# Altium schematic symbol library jlcpcb_2025_04_resistors_extended_1210.schlib: 2670 symbols (part 10 of 14) (continued)
## FRL1210JR390TS
designator R?  Resistance: 390mΩ  (hidden comment: *)
Resistor, 390mΩ, ±5%, 333.333mW, 500V, ±300ppm/℃, -55℃~+155℃, SMD 1210; Manufacturer: Uniroyal; Manufacturer Part Number: FRL1210JR390TS; Supplier 1: LCSC; Supplier Part Number 1: C2934332; JLCPCB Part Number: C2934332; Power Rating: 333.333mW; Category: Resistors; Package Size: 1210; JLCPCB Basic Part: Yes; Tolerance: ±5%; Voltage Rating: 500V; Temperature Coefficient: ±300ppm/℃; Temperature Rating: -55℃~+155℃; ComponentLink1Description: Datasheet; ComponentLink1URL: https://wmsc.lcsc.com/wmsc/upload/file/pdf/v2/lcsc/2308241947_FOJAN-FRL1210JR390TS_C2934332.pdf; ComponentLink2Description: JLCPCB Part URL; ComponentLink2URL: https://jlcpcb.com/partdetail/C2934332
pins: 1, 2
1 alternate drawing of the same symbol

## FRL1210JR400TS
designator R?  Resistance: 400mΩ  (hidden comment: *)
Resistor, 400mΩ, ±5%, 500mW, 200V, ±300ppm/℃, -55℃~+155℃, SMD 1210; Manufacturer: Uniroyal; Manufacturer Part Number: FRL1210JR400TS; Supplier 1: LCSC; Supplier Part Number 1: C2934333; JLCPCB Part Number: C2934333; Power Rating: 500mW; Category: Resistors; Package Size: 1210; JLCPCB Basic Part: Yes; Tolerance: ±5%; Voltage Rating: 200V; Temperature Coefficient: ±300ppm/℃; Temperature Rating: -55℃~+155℃; ComponentLink1Description: Datasheet; ComponentLink1URL: https://wmsc.lcsc.com/wmsc/upload/file/pdf/v2/lcsc/2308241947_FOJAN-FRL1210JR400TS_C2934333.pdf; ComponentLink2Description: JLCPCB Part URL; ComponentLink2URL: https://jlcpcb.com/partdetail/C2934333
pins: 1, 2
1 alternate drawing of the same symbol

## FRL1210JR470TS
designator R?  Resistance: 470mΩ  (hidden comment: *)
Resistor, 470mΩ, ±5%, 333.333mW, 500V, ±300ppm/℃, -55℃~+155℃, SMD 1210; Manufacturer: Uniroyal; Manufacturer Part Number: FRL1210JR470TS; Supplier 1: LCSC; Supplier Part Number 1: C2960858; JLCPCB Part Number: C2960858; Power Rating: 333.333mW; Category: Resistors; Package Size: 1210; JLCPCB Basic Part: Yes; Tolerance: ±5%; Voltage Rating: 500V; Temperature Coefficient: ±300ppm/℃; Temperature Rating: -55℃~+155℃; ComponentLink1Description: Datasheet; ComponentLink1URL: https://wmsc.lcsc.com/wmsc/upload/file/pdf/v2/lcsc/2201181800_FOJAN-FRL1210JR470TS_C2960858.pdf; ComponentLink2Description: JLCPCB Part URL; ComponentLink2URL: https://jlcpcb.com/partdetail/C2960858
pins: 1, 2
1 alternate drawing of the same symbol

## FRL1210JR500TS
designator R?  Resistance: 500mΩ  (hidden comment: *)
Resistor, 500mΩ, ±5%, 333.333mW, 500V, ±300ppm/℃, -55℃~+155℃, SMD 1210; Manufacturer: Uniroyal; Manufacturer Part Number: FRL1210JR500TS; Supplier 1: LCSC; Supplier Part Number 1: C2934335; JLCPCB Part Number: C2934335; Power Rating: 333.333mW; Category: Resistors; Package Size: 1210; JLCPCB Basic Part: Yes; Tolerance: ±5%; Voltage Rating: 500V; Temperature Coefficient: ±300ppm/℃; Temperature Rating: -55℃~+155℃; ComponentLink1Description: Datasheet; ComponentLink1URL: https://wmsc.lcsc.com/wmsc/upload/file/pdf/v2/lcsc/2201181800_FOJAN-FRL1210JR500TS_C2934335.pdf; ComponentLink2Description: JLCPCB Part URL; ComponentLink2URL: https://jlcpcb.com/partdetail/C2934335
pins: 1, 2
1 alternate drawing of the same symbol

## FRL1210JR560TS
designator R?  Resistance: 560mΩ  (hidden comment: *)
Resistor, 560mΩ, ±5%, 333.333mW, 500V, ±200ppm/℃, -55℃~+155℃, SMD 1210; Manufacturer: Uniroyal; Manufacturer Part Number: FRL1210JR560TS; Supplier 1: LCSC; Supplier Part Number 1: C2934337; JLCPCB Part Number: C2934337; Power Rating: 333.333mW; Category: Resistors; Package Size: 1210; JLCPCB Basic Part: Yes; Tolerance: ±5%; Voltage Rating: 500V; Temperature Coefficient: ±200ppm/℃; Temperature Rating: -55℃~+155℃; ComponentLink1Description: Datasheet; ComponentLink1URL: https://wmsc.lcsc.com/wmsc/upload/file/pdf/v2/lcsc/2308241947_FOJAN-FRL1210JR560TS_C2934337.pdf; ComponentLink2Description: JLCPCB Part URL; ComponentLink2URL: https://jlcpcb.com/partdetail/C2934337
pins: 1, 2
1 alternate drawing of the same symbol

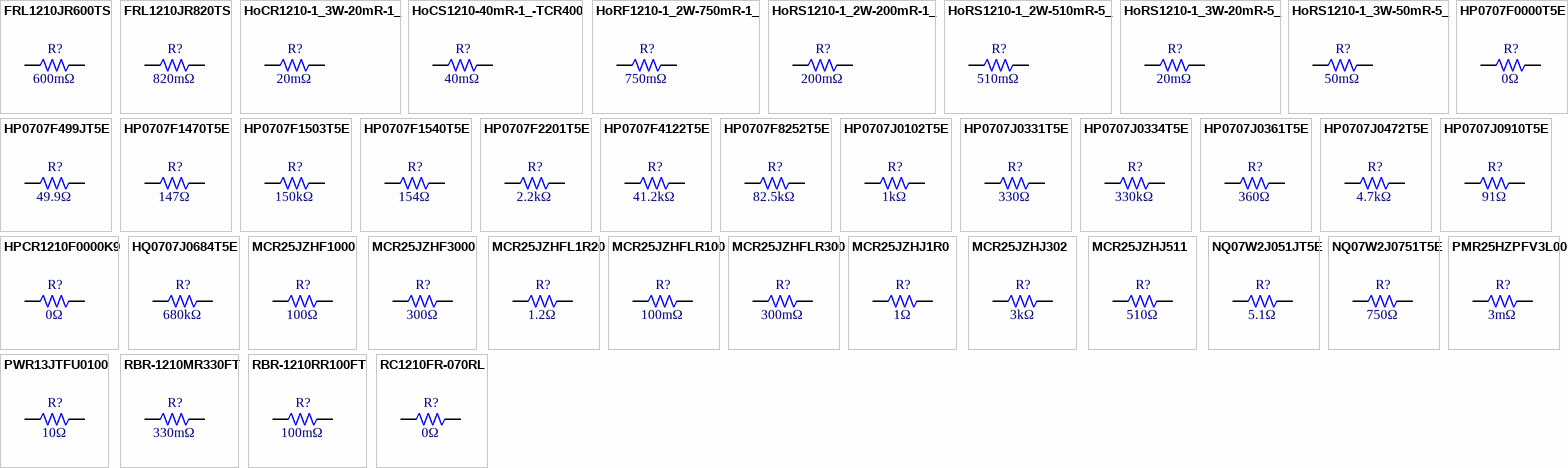
[diagram p45: symbols FRL1210JR600TS to RC1210FR-070RL]

## FRL1210JR600TS
designator R?  Resistance: 600mΩ  (hidden comment: *)
Resistor, 600mΩ, ±5%, 333.333mW, 500V, ±200ppm/℃, -55℃~+155℃, SMD 1210; Manufacturer: Uniroyal; Manufacturer Part Number: FRL1210JR600TS; Supplier 1: LCSC; Supplier Part Number 1: C2934338; JLCPCB Part Number: C2934338; Power Rating: 333.333mW; Category: Resistors; Package Size: 1210; JLCPCB Basic Part: Yes; Tolerance: ±5%; Voltage Rating: 500V; Temperature Coefficient: ±200ppm/℃; Temperature Rating: -55℃~+155℃; ComponentLink1Description: Datasheet; ComponentLink1URL: https://wmsc.lcsc.com/wmsc/upload/file/pdf/v2/lcsc/2308241947_FOJAN-FRL1210JR600TS_C2934338.pdf; ComponentLink2Description: JLCPCB Part URL; ComponentLink2URL: https://jlcpcb.com/partdetail/C2934338
pins: 1, 2
1 alternate drawing of the same symbol

## FRL1210JR820TS
designator R?  Resistance: 820mΩ  (hidden comment: *)
Resistor, 820mΩ, ±5%, 333.333mW, 500V, ±200ppm/℃, -55℃~+155℃, SMD 1210; Manufacturer: Uniroyal; Manufacturer Part Number: FRL1210JR820TS; Supplier 1: LCSC; Supplier Part Number 1: C2934340; JLCPCB Part Number: C2934340; Power Rating: 333.333mW; Category: Resistors; Package Size: 1210; JLCPCB Basic Part: Yes; Tolerance: ±5%; Voltage Rating: 500V; Temperature Coefficient: ±200ppm/℃; Temperature Rating: -55℃~+155℃; ComponentLink1Description: Datasheet; ComponentLink1URL: https://wmsc.lcsc.com/wmsc/upload/file/pdf/v2/lcsc/2308241947_FOJAN-FRL1210JR820TS_C2934340.pdf; ComponentLink2Description: JLCPCB Part URL; ComponentLink2URL: https://jlcpcb.com/partdetail/C2934340
pins: 1, 2
1 alternate drawing of the same symbol

## HoCR1210-1_3W-20mR-1_
designator R?  Resistance: 20mΩ  (hidden comment: *)
Resistor, 20mΩ, ±1%, 333.333mW, 200V, -55℃~+155℃, SMD 1210; Manufacturer: Uniroyal; Manufacturer Part Number: HoCR1210-1/3W-20mR-1%; Supplier 1: LCSC; Supplier Part Number 1: C2912625; JLCPCB Part Number: C2912625; Power Rating: 333.333mW; Category: Resistors; Package Size: 1210; JLCPCB Basic Part: Yes; Tolerance: ±1%; Voltage Rating: 200V; Temperature Rating: -55℃~+155℃; ComponentLink1Description: Datasheet; ComponentLink1URL: https://wmsc.lcsc.com/wmsc/upload/file/pdf/v2/lcsc/2111251230_Milliohm-HoCR1210-1-3W-20mR-1-_C2912625.pdf; ComponentLink2Description: JLCPCB Part URL; ComponentLink2URL: https://jlcpcb.com/partdetail/C2912625
pins: 1, 2
1 alternate drawing of the same symbol

## HoCS1210-40mR-1_-TCR400
designator R?  Resistance: 40mΩ  (hidden comment: *)
Resistor, 40mΩ, ±1%, SMD 1210; Manufacturer: Uniroyal; Manufacturer Part Number: HoCS1210-40mR-1%-TCR400; Supplier 1: LCSC; Supplier Part Number 1: C2912649; JLCPCB Part Number: C2912649; Category: Resistors; Package Size: 1210; JLCPCB Basic Part: Yes; Tolerance: ±1%; ComponentLink1Description: Datasheet; ComponentLink1URL: https://wmsc.lcsc.com/wmsc/upload/file/pdf/v2/lcsc/2111191930_Milliohm-HoCS1210-40mR-1--TCR400_C2912649.pdf; ComponentLink2Description: JLCPCB Part URL; ComponentLink2URL: https://jlcpcb.com/partdetail/C2912649
pins: 1, 2
1 alternate drawing of the same symbol

## HoRF1210-1_2W-750mR-1_
designator R?  Resistance: 750mΩ  (hidden comment: *)
Resistor, 750mΩ, ±1%, 500mW, ±500ppm/℃, -55℃~+155℃, SMD 1210; Manufacturer: Uniroyal; Manufacturer Part Number: HoRF1210-1/2W-750mR-1%; Supplier 1: LCSC; Supplier Part Number 1: C2912719; JLCPCB Part Number: C2912719; Power Rating: 500mW; Category: Resistors; Package Size: 1210; JLCPCB Basic Part: Yes; Tolerance: ±1%; Temperature Coefficient: ±500ppm/℃; Temperature Rating: -55℃~+155℃; ComponentLink1Description: Datasheet; ComponentLink1URL: https://wmsc.lcsc.com/wmsc/upload/file/pdf/v2/lcsc/2111191930_Milliohm-HoRF1210-1-2W-750mR-1-_C2912719.pdf; ComponentLink2Description: JLCPCB Part URL; ComponentLink2URL: https://jlcpcb.com/partdetail/C2912719
pins: 1, 2
1 alternate drawing of the same symbol

## HoRS1210-1_2W-200mR-1_
designator R?  Resistance: 200mΩ  (hidden comment: *)
Resistor, 200mΩ, ±1%, 500mW, ±200ppm/℃, -55℃~+155℃, SMD 1210; Manufacturer: Uniroyal; Manufacturer Part Number: HoRS1210-1/2W-200mR-1%; Supplier 1: LCSC; Supplier Part Number 1: C2912746; JLCPCB Part Number: C2912746; Power Rating: 500mW; Category: Resistors; Package Size: 1210; JLCPCB Basic Part: Yes; Tolerance: ±1%; Temperature Coefficient: ±200ppm/℃; Temperature Rating: -55℃~+155℃; ComponentLink1Description: Datasheet; ComponentLink1URL: https://wmsc.lcsc.com/wmsc/upload/file/pdf/v2/lcsc/2111191930_Milliohm-HoRS1210-1-2W-200mR-1-_C2912746.pdf; ComponentLink2Description: JLCPCB Part URL; ComponentLink2URL: https://jlcpcb.com/partdetail/C2912746
pins: 1, 2
1 alternate drawing of the same symbol

## HoRS1210-1_2W-510mR-5_
designator R?  Resistance: 510mΩ  (hidden comment: *)
Resistor, 510mΩ, ±5%, 500mW, ±500ppm/℃, -55℃~+155℃, SMD 1210; Manufacturer: Uniroyal; Manufacturer Part Number: HoRS1210-1/2W-510mR-5%; Supplier 1: LCSC; Supplier Part Number 1: C2912750; JLCPCB Part Number: C2912750; Power Rating: 500mW; Category: Resistors; Package Size: 1210; JLCPCB Basic Part: Yes; Tolerance: ±5%; Temperature Coefficient: ±500ppm/℃; Temperature Rating: -55℃~+155℃; ComponentLink1Description: Datasheet; ComponentLink1URL: https://wmsc.lcsc.com/wmsc/upload/file/pdf/v2/lcsc/2111191930_Milliohm-HoRS1210-1-2W-510mR-5-_C2912750.pdf; ComponentLink2Description: JLCPCB Part URL; ComponentLink2URL: https://jlcpcb.com/partdetail/C2912750
pins: 1, 2
1 alternate drawing of the same symbol

## HoRS1210-1_3W-20mR-5_
designator R?  Resistance: 20mΩ  (hidden comment: *)
Resistor, 20mΩ, ±5%, 333.333mW, ±800ppm/℃, -55℃~+155℃, SMD 1210; Manufacturer: Uniroyal; Manufacturer Part Number: HoRS1210-1/3W-20mR-5%; Supplier 1: LCSC; Supplier Part Number 1: C2912751; JLCPCB Part Number: C2912751; Power Rating: 333.333mW; Category: Resistors; Package Size: 1210; JLCPCB Basic Part: Yes; Tolerance: ±5%; Temperature Coefficient: ±800ppm/℃; Temperature Rating: -55℃~+155℃; ComponentLink1Description: Datasheet; ComponentLink1URL: https://wmsc.lcsc.com/wmsc/upload/file/pdf/v2/lcsc/2111190930_Milliohm-HoRS1210-1-3W-20mR-5-_C2912751.pdf; ComponentLink2Description: JLCPCB Part URL; ComponentLink2URL: https://jlcpcb.com/partdetail/C2912751
pins: 1, 2
1 alternate drawing of the same symbol

## HoRS1210-1_3W-50mR-5_
designator R?  Resistance: 50mΩ  (hidden comment: *)
Resistor, 50mΩ, ±5%, 333.333mW, ±800ppm/℃, -55℃~+155℃, SMD 1210; Manufacturer: Uniroyal; Manufacturer Part Number: HoRS1210-1/3W-50mR-5%; Supplier 1: LCSC; Supplier Part Number 1: C2912753; JLCPCB Part Number: C2912753; Power Rating: 333.333mW; Category: Resistors; Package Size: 1210; JLCPCB Basic Part: Yes; Tolerance: ±5%; Temperature Coefficient: ±800ppm/℃; Temperature Rating: -55℃~+155℃; ComponentLink1Description: Datasheet; ComponentLink1URL: https://wmsc.lcsc.com/wmsc/upload/file/pdf/v2/lcsc/2111190930_Milliohm-HoRS1210-1-3W-50mR-5-_C2912753.pdf; ComponentLink2Description: JLCPCB Part URL; ComponentLink2URL: https://jlcpcb.com/partdetail/C2912753
pins: 1, 2
1 alternate drawing of the same symbol

## HP0707F0000T5E
designator R?  Resistance: 0Ω  (hidden comment: *)
Resistor, 0Ω, ±1%, 750mW, 200V, ±100ppm/℃, -55℃~+155℃, SMD 1210; Manufacturer: Uniroyal; Manufacturer Part Number: HP0707F0000T5E; Supplier 1: LCSC; Supplier Part Number 1: C473553; JLCPCB Part Number: C473553; Power Rating: 750mW; Category: Resistors; Package Size: 1210; JLCPCB Basic Part: Yes; Tolerance: ±1%; Voltage Rating: 200V; Temperature Coefficient: ±100ppm/℃; Temperature Rating: -55℃~+155℃; ComponentLink1Description: Datasheet; ComponentLink1URL: https://wmsc.lcsc.com/wmsc/upload/file/pdf/v2/lcsc/2304140030_UNI-ROYAL-Uniroyal-Elec-HP0707F0000T5E_C473553.pdf; ComponentLink2Description: JLCPCB Part URL; ComponentLink2URL: https://jlcpcb.com/partdetail/C473553
pins: 1, 2
1 alternate drawing of the same symbol

## HP0707F499JT5E
designator R?  Resistance: 49.9Ω  (hidden comment: *)
Resistor, 49.9Ω, ±1%, 750mW, ±100ppm/℃, -55℃~+155℃, SMD 1210; Manufacturer: Uniroyal; Manufacturer Part Number: HP0707F499JT5E; Supplier 1: LCSC; Supplier Part Number 1: C2759009; JLCPCB Part Number: C2759009; Power Rating: 750mW; Category: Resistors; Package Size: 1210; JLCPCB Basic Part: Yes; Tolerance: ±1%; Temperature Coefficient: ±100ppm/℃; Temperature Rating: -55℃~+155℃; ComponentLink1Description: Datasheet; ComponentLink1URL: https://wmsc.lcsc.com/wmsc/upload/file/pdf/v2/lcsc/2304140030_UNI-ROYAL-Uniroyal-Elec-HP0707F499JT5E_C2759009.pdf; ComponentLink2Description: JLCPCB Part URL; ComponentLink2URL: https://jlcpcb.com/partdetail/C2759009
pins: 1, 2
1 alternate drawing of the same symbol

## HP0707F1470T5E
designator R?  Resistance: 147Ω  (hidden comment: *)
Resistor, 147Ω, ±1%, 750mW, 200V, ±100ppm/℃, -55℃~+155℃, SMD 1210; Manufacturer: Uniroyal; Manufacturer Part Number: HP0707F1470T5E; Supplier 1: LCSC; Supplier Part Number 1: C2759023; JLCPCB Part Number: C2759023; Power Rating: 750mW; Category: Resistors; Package Size: 1210; JLCPCB Basic Part: Yes; Tolerance: ±1%; Voltage Rating: 200V; Temperature Coefficient: ±100ppm/℃; Temperature Rating: -55℃~+155℃; ComponentLink1Description: Datasheet; ComponentLink1URL: https://wmsc.lcsc.com/wmsc/upload/file/pdf/v2/lcsc/2304140030_UNI-ROYAL-Uniroyal-Elec-HP0707F1470T5E_C2759023.pdf; ComponentLink2Description: JLCPCB Part URL; ComponentLink2URL: https://jlcpcb.com/partdetail/C2759023
pins: 1, 2
1 alternate drawing of the same symbol

## HP0707F1503T5E
designator R?  Resistance: 150kΩ  (hidden comment: *)
Resistor, 150kΩ, ±1%, 750mW, 200V, ±100ppm/℃, -55℃~+155℃, SMD 1210; Manufacturer: Uniroyal; Manufacturer Part Number: HP0707F1503T5E; Supplier 1: LCSC; Supplier Part Number 1: C2759022; JLCPCB Part Number: C2759022; Power Rating: 750mW; Category: Resistors; Package Size: 1210; JLCPCB Basic Part: Yes; Tolerance: ±1%; Voltage Rating: 200V; Temperature Coefficient: ±100ppm/℃; Temperature Rating: -55℃~+155℃; ComponentLink1Description: Datasheet; ComponentLink1URL: https://wmsc.lcsc.com/wmsc/upload/file/pdf/v2/lcsc/2304140030_UNI-ROYAL-Uniroyal-Elec-HP0707F1503T5E_C2759022.pdf; ComponentLink2Description: JLCPCB Part URL; ComponentLink2URL: https://jlcpcb.com/partdetail/C2759022
pins: 1, 2
1 alternate drawing of the same symbol

## HP0707F1540T5E
designator R?  Resistance: 154Ω  (hidden comment: *)
Resistor, 154Ω, ±1%, 750mW, 200V, ±100ppm/℃, -55℃~+155℃, SMD 1210; Manufacturer: Uniroyal; Manufacturer Part Number: HP0707F1540T5E; Supplier 1: LCSC; Supplier Part Number 1: C2759021; JLCPCB Part Number: C2759021; Power Rating: 750mW; Category: Resistors; Package Size: 1210; JLCPCB Basic Part: Yes; Tolerance: ±1%; Voltage Rating: 200V; Temperature Coefficient: ±100ppm/℃; Temperature Rating: -55℃~+155℃; ComponentLink1Description: Datasheet; ComponentLink1URL: https://wmsc.lcsc.com/wmsc/upload/file/pdf/v2/lcsc/2304140030_UNI-ROYAL-Uniroyal-Elec-HP0707F1540T5E_C2759021.pdf; ComponentLink2Description: JLCPCB Part URL; ComponentLink2URL: https://jlcpcb.com/partdetail/C2759021
pins: 1, 2
1 alternate drawing of the same symbol

## HP0707F2201T5E
designator R?  Resistance: 2.2kΩ  (hidden comment: *)
Resistor, 2.2kΩ, ±1%, 750mW, 200V, ±100ppm/℃, -55℃~+155℃, SMD 1210; Manufacturer: Uniroyal; Manufacturer Part Number: HP0707F2201T5E; Supplier 1: LCSC; Supplier Part Number 1: C2759017; JLCPCB Part Number: C2759017; Power Rating: 750mW; Category: Resistors; Package Size: 1210; JLCPCB Basic Part: Yes; Tolerance: ±1%; Voltage Rating: 200V; Temperature Coefficient: ±100ppm/℃; Temperature Rating: -55℃~+155℃; ComponentLink1Description: Datasheet; ComponentLink1URL: https://wmsc.lcsc.com/wmsc/upload/file/pdf/v2/lcsc/2304140030_UNI-ROYAL-Uniroyal-Elec-HP0707F2201T5E_C2759017.pdf; ComponentLink2Description: JLCPCB Part URL; ComponentLink2URL: https://jlcpcb.com/partdetail/C2759017
pins: 1, 2
1 alternate drawing of the same symbol

## HP0707F4122T5E
designator R?  Resistance: 41.2kΩ  (hidden comment: *)
Resistor, 41.2kΩ, ±1%, 750mW, 200V, ±100ppm/℃, -55℃~+155℃, SMD 1210; Manufacturer: Uniroyal; Manufacturer Part Number: HP0707F4122T5E; Supplier 1: LCSC; Supplier Part Number 1: C2759010; JLCPCB Part Number: C2759010; Power Rating: 750mW; Category: Resistors; Package Size: 1210; JLCPCB Basic Part: Yes; Tolerance: ±1%; Voltage Rating: 200V; Temperature Coefficient: ±100ppm/℃; Temperature Rating: -55℃~+155℃; ComponentLink1Description: Datasheet; ComponentLink1URL: https://wmsc.lcsc.com/wmsc/upload/file/pdf/v2/lcsc/2304140030_UNI-ROYAL-Uniroyal-Elec-HP0707F4122T5E_C2759010.pdf; ComponentLink2Description: JLCPCB Part URL; ComponentLink2URL: https://jlcpcb.com/partdetail/C2759010
pins: 1, 2
1 alternate drawing of the same symbol

## HP0707F8252T5E
designator R?  Resistance: 82.5kΩ  (hidden comment: *)
Resistor, 82.5kΩ, ±1%, 750mW, 200V, ±100ppm/℃, -55℃~+155℃, SMD 1210; Manufacturer: Uniroyal; Manufacturer Part Number: HP0707F8252T5E; Supplier 1: LCSC; Supplier Part Number 1: C2759008; JLCPCB Part Number: C2759008; Power Rating: 750mW; Category: Resistors; Package Size: 1210; JLCPCB Basic Part: Yes; Tolerance: ±1%; Voltage Rating: 200V; Temperature Coefficient: ±100ppm/℃; Temperature Rating: -55℃~+155℃; ComponentLink1Description: Datasheet; ComponentLink1URL: https://wmsc.lcsc.com/wmsc/upload/file/pdf/v2/lcsc/2304140030_UNI-ROYAL-Uniroyal-Elec-HP0707F8252T5E_C2759008.pdf; ComponentLink2Description: JLCPCB Part URL; ComponentLink2URL: https://jlcpcb.com/partdetail/C2759008
pins: 1, 2
1 alternate drawing of the same symbol

## HP0707J0102T5E
designator R?  Resistance: 1kΩ  (hidden comment: *)
Resistor, 1kΩ, ±5%, 750mW, 200V, ±100ppm/℃, -55℃~+155℃, SMD 1210; Manufacturer: Uniroyal; Manufacturer Part Number: HP0707J0102T5E; Supplier 1: LCSC; Supplier Part Number 1: C2759006; JLCPCB Part Number: C2759006; Power Rating: 750mW; Category: Resistors; Package Size: 1210; JLCPCB Basic Part: Yes; Tolerance: ±5%; Voltage Rating: 200V; Temperature Coefficient: ±100ppm/℃; Temperature Rating: -55℃~+155℃; ComponentLink1Description: Datasheet; ComponentLink1URL: https://wmsc.lcsc.com/wmsc/upload/file/pdf/v2/lcsc/2304140030_UNI-ROYAL-Uniroyal-Elec-HP0707J0102T5E_C2759006.pdf; ComponentLink2Description: JLCPCB Part URL; ComponentLink2URL: https://jlcpcb.com/partdetail/C2759006
pins: 1, 2
1 alternate drawing of the same symbol

## HP0707J0331T5E
designator R?  Resistance: 330Ω  (hidden comment: *)
Resistor, 330Ω, ±5%, 750mW, 200V, ±100ppm/℃, -55℃~+155℃, SMD 1210; Manufacturer: Uniroyal; Manufacturer Part Number: HP0707J0331T5E; Supplier 1: LCSC; Supplier Part Number 1: C2759001; JLCPCB Part Number: C2759001; Power Rating: 750mW; Category: Resistors; Package Size: 1210; JLCPCB Basic Part: Yes; Tolerance: ±5%; Voltage Rating: 200V; Temperature Coefficient: ±100ppm/℃; Temperature Rating: -55℃~+155℃; ComponentLink1Description: Datasheet; ComponentLink1URL: https://wmsc.lcsc.com/wmsc/upload/file/pdf/v2/lcsc/2304140030_UNI-ROYAL-Uniroyal-Elec-HP0707J0331T5E_C2759001.pdf; ComponentLink2Description: JLCPCB Part URL; ComponentLink2URL: https://jlcpcb.com/partdetail/C2759001
pins: 1, 2
1 alternate drawing of the same symbol

## HP0707J0334T5E
designator R?  Resistance: 330kΩ  (hidden comment: *)
Resistor, 330kΩ, ±5%, 750mW, 200V, ±100ppm/℃, -55℃~+155℃, SMD 1210; Manufacturer: Uniroyal; Manufacturer Part Number: HP0707J0334T5E; Supplier 1: LCSC; Supplier Part Number 1: C2759000; JLCPCB Part Number: C2759000; Power Rating: 750mW; Category: Resistors; Package Size: 1210; JLCPCB Basic Part: Yes; Tolerance: ±5%; Voltage Rating: 200V; Temperature Coefficient: ±100ppm/℃; Temperature Rating: -55℃~+155℃; ComponentLink1Description: Datasheet; ComponentLink1URL: https://wmsc.lcsc.com/wmsc/upload/file/pdf/v2/lcsc/2304140030_UNI-ROYAL-Uniroyal-Elec-HP0707J0334T5E_C2759000.pdf; ComponentLink2Description: JLCPCB Part URL; ComponentLink2URL: https://jlcpcb.com/partdetail/C2759000
pins: 1, 2
1 alternate drawing of the same symbol

## HP0707J0361T5E
designator R?  Resistance: 360Ω  (hidden comment: *)
Resistor, 360Ω, ±5%, 750mW, 200V, ±100ppm/℃, -55℃~+155℃, SMD 1210; Manufacturer: Uniroyal; Manufacturer Part Number: HP0707J0361T5E; Supplier 1: LCSC; Supplier Part Number 1: C2758999; JLCPCB Part Number: C2758999; Power Rating: 750mW; Category: Resistors; Package Size: 1210; JLCPCB Basic Part: Yes; Tolerance: ±5%; Voltage Rating: 200V; Temperature Coefficient: ±100ppm/℃; Temperature Rating: -55℃~+155℃; ComponentLink1Description: Datasheet; ComponentLink1URL: https://wmsc.lcsc.com/wmsc/upload/file/pdf/v2/lcsc/2304140030_UNI-ROYAL-Uniroyal-Elec-HP0707J0361T5E_C2758999.pdf; ComponentLink2Description: JLCPCB Part URL; ComponentLink2URL: https://jlcpcb.com/partdetail/C2758999
pins: 1, 2
1 alternate drawing of the same symbol

## HP0707J0472T5E
designator R?  Resistance: 4.7kΩ  (hidden comment: *)
Resistor, 4.7kΩ, ±5%, 750mW, 200V, ±100ppm/℃, -55℃~+155℃, SMD 1210; Manufacturer: Uniroyal; Manufacturer Part Number: HP0707J0472T5E; Supplier 1: LCSC; Supplier Part Number 1: C2758997; JLCPCB Part Number: C2758997; Power Rating: 750mW; Category: Resistors; Package Size: 1210; JLCPCB Basic Part: Yes; Tolerance: ±5%; Voltage Rating: 200V; Temperature Coefficient: ±100ppm/℃; Temperature Rating: -55℃~+155℃; ComponentLink1Description: Datasheet; ComponentLink1URL: https://wmsc.lcsc.com/wmsc/upload/file/pdf/v2/lcsc/2304140030_UNI-ROYAL-Uniroyal-Elec-HP0707J0472T5E_C2758997.pdf; ComponentLink2Description: JLCPCB Part URL; ComponentLink2URL: https://jlcpcb.com/partdetail/C2758997
pins: 1, 2
1 alternate drawing of the same symbol

## HP0707J0910T5E
designator R?  Resistance: 91Ω  (hidden comment: *)
Resistor, 91Ω, ±5%, 750mW, 200V, ±100ppm/℃, -55℃~+155℃, SMD 1210; Manufacturer: Uniroyal; Manufacturer Part Number: HP0707J0910T5E; Supplier 1: LCSC; Supplier Part Number 1: C2758994; JLCPCB Part Number: C2758994; Power Rating: 750mW; Category: Resistors; Package Size: 1210; JLCPCB Basic Part: Yes; Tolerance: ±5%; Voltage Rating: 200V; Temperature Coefficient: ±100ppm/℃; Temperature Rating: -55℃~+155℃; ComponentLink1Description: Datasheet; ComponentLink1URL: https://wmsc.lcsc.com/wmsc/upload/file/pdf/v2/lcsc/2304140030_UNI-ROYAL-Uniroyal-Elec-HP0707J0910T5E_C2758994.pdf; ComponentLink2Description: JLCPCB Part URL; ComponentLink2URL: https://jlcpcb.com/partdetail/C2758994
pins: 1, 2
1 alternate drawing of the same symbol

## HPCR1210F0000K9
designator R?  Resistance: 0Ω  (hidden comment: *)
Resistor, 0Ω, ±1%, 500mW, 200V, ±100ppm/℃, -55℃~+125℃, SMD 1210; Manufacturer: Uniroyal; Manufacturer Part Number: HPCR1210F0000K9; Supplier 1: LCSC; Supplier Part Number 1: C365488; JLCPCB Part Number: C365488; Power Rating: 500mW; Category: Resistors; Package Size: 1210; JLCPCB Basic Part: Yes; Tolerance: ±1%; Voltage Rating: 200V; Temperature Coefficient: ±100ppm/℃; Temperature Rating: -55℃~+125℃; ComponentLink1Description: Datasheet; ComponentLink1URL: https://wmsc.lcsc.com/wmsc/upload/file/pdf/v2/lcsc/2304140030_RESI-HPCR1210F0000K9_C365488.pdf; ComponentLink2Description: JLCPCB Part URL; ComponentLink2URL: https://jlcpcb.com/partdetail/C365488
pins: 1, 2
1 alternate drawing of the same symbol

## HQ0707J0684T5E
designator R?  Resistance: 680kΩ  (hidden comment: *)
Resistor, 680kΩ, ±5%, 750mW, 200V, ±100ppm/℃, -55℃~+155℃, SMD 1210; Manufacturer: Uniroyal; Manufacturer Part Number: HQ0707J0684T5E; Supplier 1: LCSC; Supplier Part Number 1: C414839; JLCPCB Part Number: C414839; Power Rating: 750mW; Category: Resistors; Package Size: 1210; JLCPCB Basic Part: Yes; Tolerance: ±5%; Voltage Rating: 200V; Temperature Coefficient: ±100ppm/℃; Temperature Rating: -55℃~+155℃; ComponentLink1Description: Datasheet; ComponentLink1URL: https://wmsc.lcsc.com/wmsc/upload/file/pdf/v2/lcsc/1912111437_UNI-ROYAL-Uniroyal-Elec-HQ0707J0684T5E_C414839.pdf; ComponentLink2Description: JLCPCB Part URL; ComponentLink2URL: https://jlcpcb.com/partdetail/C414839
pins: 1, 2
1 alternate drawing of the same symbol

## MCR25JZHF1000
designator R?  Resistance: 100Ω  (hidden comment: *)
Resistor, 100Ω, ±1%, 500mW, 200V, ±100ppm/℃, -55℃~+155℃, SMD 1210; Manufacturer: Uniroyal; Manufacturer Part Number: MCR25JZHF1000; Supplier 1: LCSC; Supplier Part Number 1: C525595; JLCPCB Part Number: C525595; Power Rating: 500mW; Category: Resistors; Package Size: 1210; JLCPCB Basic Part: Yes; Tolerance: ±1%; Voltage Rating: 200V; Temperature Coefficient: ±100ppm/℃; Temperature Rating: -55℃~+155℃; ComponentLink1Description: Datasheet; ComponentLink1URL: https://wmsc.lcsc.com/wmsc/upload/file/pdf/v2/lcsc/2004291535_ROHM-Semicon-MCR25JZHF1000_C525595.pdf; ComponentLink2Description: JLCPCB Part URL; ComponentLink2URL: https://jlcpcb.com/partdetail/C525595
pins: 1, 2
1 alternate drawing of the same symbol

## MCR25JZHF3000
designator R?  Resistance: 300Ω  (hidden comment: *)
Resistor, 300Ω, ±1%, 500mW, 200V, ±100ppm/℃, -55℃~+155℃, SMD 1210; Manufacturer: Uniroyal; Manufacturer Part Number: MCR25JZHF3000; Supplier 1: LCSC; Supplier Part Number 1: C507500; JLCPCB Part Number: C507500; Power Rating: 500mW; Category: Resistors; Package Size: 1210; JLCPCB Basic Part: Yes; Tolerance: ±1%; Voltage Rating: 200V; Temperature Coefficient: ±100ppm/℃; Temperature Rating: -55℃~+155℃; ComponentLink1Description: Datasheet; ComponentLink1URL: https://wmsc.lcsc.com/wmsc/upload/file/pdf/v2/lcsc/2004022118_ROHM-Semicon-MCR25JZHF3000_C507500.pdf; ComponentLink2Description: JLCPCB Part URL; ComponentLink2URL: https://jlcpcb.com/partdetail/C507500
pins: 1, 2
1 alternate drawing of the same symbol

## MCR25JZHFL1R20
designator R?  Resistance: 1.2Ω  (hidden comment: *)
Resistor, 1.2Ω, ±1%, 500mW, 200V, ±200ppm/℃, -55℃~+155℃, SMD 1210; Manufacturer: Uniroyal; Manufacturer Part Number: MCR25JZHFL1R20; Supplier 1: LCSC; Supplier Part Number 1: C559352; JLCPCB Part Number: C559352; Power Rating: 500mW; Category: Resistors; Package Size: 1210; JLCPCB Basic Part: Yes; Tolerance: ±1%; Voltage Rating: 200V; Temperature Coefficient: ±200ppm/℃; Temperature Rating: -55℃~+155℃; ComponentLink1Description: Datasheet; ComponentLink1URL: https://wmsc.lcsc.com/wmsc/upload/file/pdf/v2/lcsc/2008051503_ROHM-Semicon-MCR25JZHFL1R20_C559352.pdf; ComponentLink2Description: JLCPCB Part URL; ComponentLink2URL: https://jlcpcb.com/partdetail/C559352
pins: 1, 2
1 alternate drawing of the same symbol

## MCR25JZHFLR100
designator R?  Resistance: 100mΩ  (hidden comment: *)
Resistor, 100mΩ, ±1%, 200V, ±100ppm/℃, -55℃~+155℃, SMD 1210; Manufacturer: Uniroyal; Manufacturer Part Number: MCR25JZHFLR100; Supplier 1: LCSC; Supplier Part Number 1: C426496; JLCPCB Part Number: C426496; Category: Resistors; Package Size: 1210; JLCPCB Basic Part: Yes; Tolerance: ±1%; Voltage Rating: 200V; Temperature Coefficient: ±100ppm/℃; Temperature Rating: -55℃~+155℃; ComponentLink1Description: Datasheet; ComponentLink1URL: https://wmsc.lcsc.com/wmsc/upload/file/pdf/v2/lcsc/1912111437_ROHM-Semicon-MCR25JZHFLR100_C426496.pdf; ComponentLink2Description: JLCPCB Part URL; ComponentLink2URL: https://jlcpcb.com/partdetail/C426496
pins: 1, 2
1 alternate drawing of the same symbol

## MCR25JZHFLR300
designator R?  Resistance: 300mΩ  (hidden comment: *)
Resistor, 300mΩ, ±1%, 500mW, 200V, -55℃~+155℃, SMD 1210; Manufacturer: Uniroyal; Manufacturer Part Number: MCR25JZHFLR300; Supplier 1: LCSC; Supplier Part Number 1: C308541; JLCPCB Part Number: C308541; Power Rating: 500mW; Category: Resistors; Package Size: 1210; JLCPCB Basic Part: Yes; Tolerance: ±1%; Voltage Rating: 200V; Temperature Rating: -55℃~+155℃; ComponentLink1Description: Datasheet; ComponentLink1URL: https://wmsc.lcsc.com/wmsc/upload/file/pdf/v2/lcsc/1810171820_ROHM-Semicon-MCR25JZHFLR300_C308541.pdf; ComponentLink2Description: JLCPCB Part URL; ComponentLink2URL: https://jlcpcb.com/partdetail/C308541
pins: 1, 2
1 alternate drawing of the same symbol

## MCR25JZHJ1R0
designator R?  Resistance: 1Ω  (hidden comment: *)
Resistor, 1Ω, ±5%, 500mW, 200V, -150ppm/℃~+850ppm/℃, -55℃~+155℃, SMD 1210; Manufacturer: Uniroyal; Manufacturer Part Number: MCR25JZHJ1R0; Supplier 1: LCSC; Supplier Part Number 1: C308545; JLCPCB Part Number: C308545; Power Rating: 500mW; Category: Resistors; Package Size: 1210; JLCPCB Basic Part: Yes; Tolerance: ±5%; Voltage Rating: 200V; Temperature Coefficient: -150ppm/℃~+850ppm/℃; Temperature Rating: -55℃~+155℃; ComponentLink1Description: Datasheet; ComponentLink1URL: https://wmsc.lcsc.com/wmsc/upload/file/pdf/v2/lcsc/2304140030_ROHM-Semicon-MCR25JZHJ1R0_C308545.pdf; ComponentLink2Description: JLCPCB Part URL; ComponentLink2URL: https://jlcpcb.com/partdetail/C308545
pins: 1, 2
1 alternate drawing of the same symbol

## MCR25JZHJ302
designator R?  Resistance: 3kΩ  (hidden comment: *)
Resistor, 3kΩ, ±5%, 500mW, 200V, ±200ppm/℃, -55℃~+155℃, SMD 1210; Manufacturer: Uniroyal; Manufacturer Part Number: MCR25JZHJ302; Supplier 1: LCSC; Supplier Part Number 1: C308549; JLCPCB Part Number: C308549; Power Rating: 500mW; Category: Resistors; Package Size: 1210; JLCPCB Basic Part: Yes; Tolerance: ±5%; Voltage Rating: 200V; Temperature Coefficient: ±200ppm/℃; Temperature Rating: -55℃~+155℃; ComponentLink1Description: Datasheet; ComponentLink1URL: https://wmsc.lcsc.com/wmsc/upload/file/pdf/v2/lcsc/2304140030_ROHM-Semicon-MCR25JZHJ302_C308549.pdf; ComponentLink2Description: JLCPCB Part URL; ComponentLink2URL: https://jlcpcb.com/partdetail/C308549
pins: 1, 2
1 alternate drawing of the same symbol

## MCR25JZHJ511
designator R?  Resistance: 510Ω  (hidden comment: *)
Resistor, 510Ω, ±5%, 500mW, 200V, ±200ppm/℃, -55℃~+155℃, SMD 1210; Manufacturer: Uniroyal; Manufacturer Part Number: MCR25JZHJ511; Supplier 1: LCSC; Supplier Part Number 1: C308550; JLCPCB Part Number: C308550; Power Rating: 500mW; Category: Resistors; Package Size: 1210; JLCPCB Basic Part: Yes; Tolerance: ±5%; Voltage Rating: 200V; Temperature Coefficient: ±200ppm/℃; Temperature Rating: -55℃~+155℃; ComponentLink1Description: Datasheet; ComponentLink1URL: https://wmsc.lcsc.com/wmsc/upload/file/pdf/v2/lcsc/2304140030_ROHM-Semicon-MCR25JZHJ511_C308550.pdf; ComponentLink2Description: JLCPCB Part URL; ComponentLink2URL: https://jlcpcb.com/partdetail/C308550
pins: 1, 2
1 alternate drawing of the same symbol

## NQ07W2J051JT5E
designator R?  Resistance: 5.1Ω  (hidden comment: *)
Resistor, 5.1Ω, ±5%, 500mW, ±200ppm/℃, SMD 1210; Manufacturer: Uniroyal; Manufacturer Part Number: NQ07W2J051JT5E; Supplier 1: LCSC; Supplier Part Number 1: C964977; JLCPCB Part Number: C964977; Power Rating: 500mW; Category: Resistors; Package Size: 1210; JLCPCB Basic Part: Yes; Tolerance: ±5%; Temperature Coefficient: ±200ppm/℃; ComponentLink1Description: Datasheet; ComponentLink1URL: https://wmsc.lcsc.com/wmsc/upload/file/pdf/v2/lcsc/2304140030_UNI-ROYAL-Uniroyal-Elec-NQ07W2J051JT5E_C964977.pdf; ComponentLink2Description: JLCPCB Part URL; ComponentLink2URL: https://jlcpcb.com/partdetail/C964977
pins: 1, 2
1 alternate drawing of the same symbol

## NQ07W2J0751T5E
designator R?  Resistance: 750Ω  (hidden comment: *)
Resistor, 750Ω, ±5%, 500mW, ±100ppm/℃, SMD 1210; Manufacturer: Uniroyal; Manufacturer Part Number: NQ07W2J0751T5E; Supplier 1: LCSC; Supplier Part Number 1: C964976; JLCPCB Part Number: C964976; Power Rating: 500mW; Category: Resistors; Package Size: 1210; JLCPCB Basic Part: Yes; Tolerance: ±5%; Temperature Coefficient: ±100ppm/℃; ComponentLink1Description: Datasheet; ComponentLink1URL: https://wmsc.lcsc.com/wmsc/upload/file/pdf/v2/lcsc/2304140030_UNI-ROYAL-Uniroyal-Elec-NQ07W2J0751T5E_C964976.pdf; ComponentLink2Description: JLCPCB Part URL; ComponentLink2URL: https://jlcpcb.com/partdetail/C964976
pins: 1, 2
1 alternate drawing of the same symbol

## PMR25HZPFV3L00
designator R?  Resistance: 3mΩ  (hidden comment: *)
Resistor, 3mΩ, ±1%, 1W, ±100ppm/℃, -55℃~+155℃, SMD 1210; Manufacturer: Uniroyal; Manufacturer Part Number: PMR25HZPFV3L00; Supplier 1: LCSC; Supplier Part Number 1: C509736; JLCPCB Part Number: C509736; Power Rating: 1W; Category: Resistors; Package Size: 1210; JLCPCB Basic Part: Yes; Tolerance: ±1%; Temperature Coefficient: ±100ppm/℃; Temperature Rating: -55℃~+155℃; ComponentLink1Description: Datasheet; ComponentLink2Description: JLCPCB Part URL; ComponentLink2URL: https://jlcpcb.com/partdetail/C509736
pins: 1, 2
1 alternate drawing of the same symbol

## PWR13JTFU0100
designator R?  Resistance: 10Ω  (hidden comment: *)
Resistor, 10Ω, ±5%, 500mW, 200V, ±200ppm/℃, -55℃~+155℃, SMD 1210; Manufacturer: Uniroyal; Manufacturer Part Number: PWR13JTFU0100; Supplier 1: LCSC; Supplier Part Number 1: C2924169; JLCPCB Part Number: C2924169; Power Rating: 500mW; Category: Resistors; Package Size: 1210; JLCPCB Basic Part: Yes; Tolerance: ±5%; Voltage Rating: 200V; Temperature Coefficient: ±200ppm/℃; Temperature Rating: -55℃~+155℃; ComponentLink1Description: Datasheet; ComponentLink1URL: https://wmsc.lcsc.com/wmsc/upload/file/pdf/v2/lcsc/2111241930_Viking-Tech-PWR13JTFU0100_C2924169.pdf; ComponentLink2Description: JLCPCB Part URL; ComponentLink2URL: https://jlcpcb.com/partdetail/C2924169
pins: 1, 2
1 alternate drawing of the same symbol

## RBR-1210MR330FT
designator R?  Resistance: 330mΩ  (hidden comment: *)
Resistor, 330mΩ, ±1%, 333.333mW, ±500ppm/℃, SMD 1210; Manufacturer: Uniroyal; Manufacturer Part Number: RBR-1210MR330FT; Supplier 1: LCSC; Supplier Part Number 1: C914008; JLCPCB Part Number: C914008; Power Rating: 333.333mW; Category: Resistors; Package Size: 1210; JLCPCB Basic Part: Yes; Tolerance: ±1%; Temperature Coefficient: ±500ppm/℃; ComponentLink1Description: Datasheet; ComponentLink1URL: https://wmsc.lcsc.com/wmsc/upload/file/pdf/v2/lcsc/2011180208_FH--Guangdong-Fenghua-Advanced-Tech-RBR-1210MR330FT_C914008.pdf; ComponentLink2Description: JLCPCB Part URL; ComponentLink2URL: https://jlcpcb.com/partdetail/C914008
pins: 1, 2
1 alternate drawing of the same symbol

## RBR-1210RR100FT
designator R?  Resistance: 100mΩ  (hidden comment: *)
Resistor, 100mΩ, ±1%, 333.333mW, ±700ppm/℃, -55℃~+155℃, SMD 1210; Manufacturer: Uniroyal; Manufacturer Part Number: RBR-1210RR100FT; Supplier 1: LCSC; Supplier Part Number 1: C341630; JLCPCB Part Number: C341630; Power Rating: 333.333mW; Category: Resistors; Package Size: 1210; JLCPCB Basic Part: Yes; Tolerance: ±1%; Temperature Coefficient: ±700ppm/℃; Temperature Rating: -55℃~+155℃; ComponentLink1Description: Datasheet; ComponentLink1URL: https://wmsc.lcsc.com/wmsc/upload/file/pdf/v2/lcsc/1912111437_FH--Guangdong-Fenghua-Advanced-Tech-RBR-1210RR100FT_C341630.pdf; ComponentLink2Description: JLCPCB Part URL; ComponentLink2URL: https://jlcpcb.com/partdetail/C341630
pins: 1, 2
1 alternate drawing of the same symbol

## RC1210FR-070RL
designator R?  Resistance: 0Ω  (hidden comment: *)
Resistor, 0Ω, ±1%, 500mW, 200V, -55℃~+155℃, SMD 1210; Manufacturer: Uniroyal; Manufacturer Part Number: RC1210FR-070RL; Supplier 1: LCSC; Supplier Part Number 1: C137106; JLCPCB Part Number: C137106; Power Rating: 500mW; Category: Resistors; Package Size: 1210; JLCPCB Basic Part: Yes; Tolerance: ±1%; Voltage Rating: 200V; Temperature Rating: -55℃~+155℃; ComponentLink1Description: Datasheet; ComponentLink1URL: https://wmsc.lcsc.com/wmsc/upload/file/pdf/v2/lcsc/2304140030_YAGEO-RC1210FR-070RL_C137106.pdf; ComponentLink2Description: JLCPCB Part URL; ComponentLink2URL: https://jlcpcb.com/partdetail/C137106
pins: 1, 2
1 alternate drawing of the same symbol

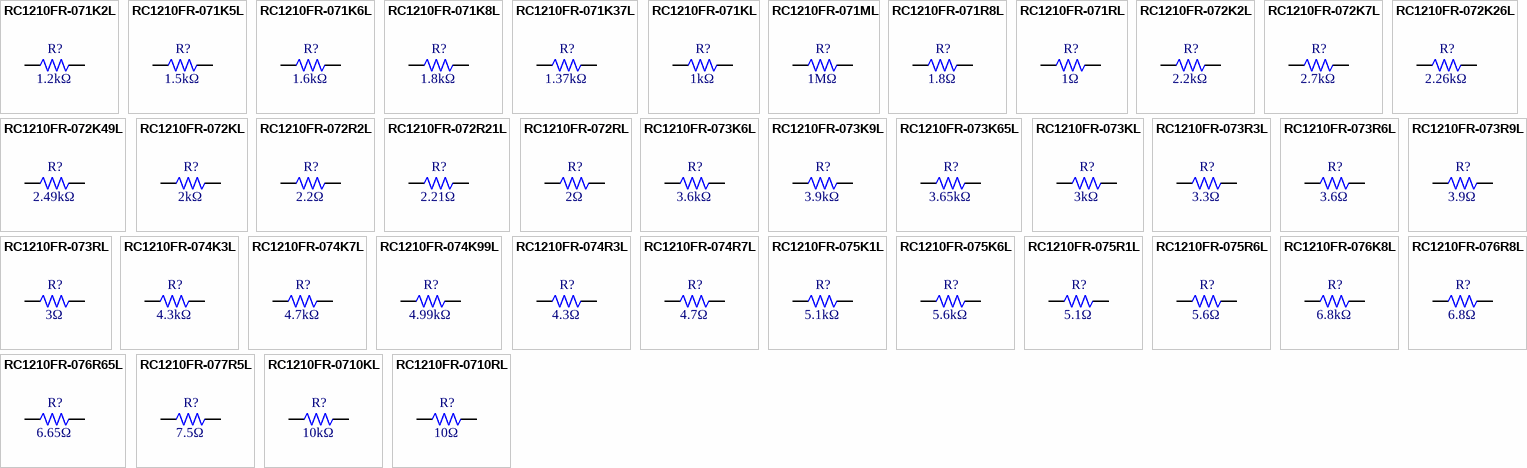
[diagram p46: symbols RC1210FR-071K2L to RC1210FR-0710RL]

## RC1210FR-071K2L
designator R?  Resistance: 1.2kΩ  (hidden comment: *)
Resistor, 1.2kΩ, ±1%, 500mW, 200V, ±100ppm/℃, -55℃~+155℃, SMD 1210; Manufacturer: Uniroyal; Manufacturer Part Number: RC1210FR-071K2L; Supplier 1: LCSC; Supplier Part Number 1: C163355; JLCPCB Part Number: C163355; Power Rating: 500mW; Category: Resistors; Package Size: 1210; JLCPCB Basic Part: Yes; Tolerance: ±1%; Voltage Rating: 200V; Temperature Coefficient: ±100ppm/℃; Temperature Rating: -55℃~+155℃; ComponentLink1Description: Datasheet; ComponentLink1URL: https://wmsc.lcsc.com/wmsc/upload/file/pdf/v2/lcsc/2304140030_YAGEO-RC1210FR-071K2L_C163355.pdf; ComponentLink2Description: JLCPCB Part URL; ComponentLink2URL: https://jlcpcb.com/partdetail/C163355
pins: 1, 2
1 alternate drawing of the same symbol
